# Altium schematic symbol library Schlib.SchLib: 725 symbols (part 4 of 6) (continued)
## MCP1702T-3302E/CB
designator U?  (value not drawn)
44dB@(100Hz) 250mA Fixed 3.3V Positive 13.2V SOT-23-3L Linear Voltage Regulators (LDO) ROHS; Manufacturer: Microchip; Manufacturer Part Number: MCP1702T-3302E/CB; Accuracy: 2%; Dropout Voltage: 525mV; Input Bias Current: 2µA; Min Input Voltage: 2.7V; Nominal Supply Current: 5µA; Number of Channels: 1; Power Dissipation: 253mW; Supplier: RS; Supplier Part Number: 7386578P; RoHS: Compliant; Category: LDO Voltage Regulators; Stock: 4180; Pricing: 30=0.449, 100=0.409 (GBP); Projected EOL Date: 2034-09-28; Case/Package: SOT-23; Contact Plating: Tin; Country of Assembly: Taiwan, Thailand; Country of Fabrication: United States of America; Country of Origin: Taiwan, Thailand; Export Control Classification Number (ECCN) Code: EAR99; Height: 1.3mm; Harmonized Tariff Schedule (HTS) Code: 8542.39.0060; Introduction Date: 2006-09-28; Lead Free: Lead Free; Length: 3.1mm; Lifecycle Status: Production; Max Supply Voltage: 13.2V; Max Operating Temperature: 125°C; Max Output current: 250mA; Min Operating Temperature: -40°C; Min Output Voltage: 3.3V; Mounting Technology: Surface Mount; Nominal Output Voltage: 3.3V; Number of Outputs: 1; Pins: 3; Output Current: 250mA; Output Type: Fixed; Output Voltage: 3.3V; Output Voltage Accuracy: 2%; Packaging: Cut Tape; Polarity: Positive; Quiescent Current: 5µA; Radiation Hardening: No; REACH SVHC: No; Schedule B: 8542390000, 8542390000|8542390000|8542390000|8542390000|8542390000; Width: 1.8mm; ComponentLink1URL: https://datasheet.octopart.com:443/MCP1702T-3302E/CB-Microchip-datasheet-10060743.pdf?src-supplier=LKR; ComponentLink1Description: https://datasheet.octopart.com:443/MCP1702T-3302E/CB-Microchip-datasheet-10060743.pdf?src-supplier=LKR; ComponentLink2URL: https://datasheet.octopart.com:443/MCP1702T-3302E-CB-Microchip-datasheet-175858685.pdf?src-supplier=Microchip; ComponentLink2Description: https://datasheet.octopart.com:443/MCP1702T-3302E-CB-Microchip-datasheet-175858685.pdf?src-supplier=Microchip; ComponentLink3URL: https://datasheet.octopart.com:443/MCP1702T-3302E/CB-Microchip-datasheet-15716.pdf?src-supplier=TME; ComponentLink3Description: https://datasheet.octopart.com:443/MCP1702T-3302E/CB-Microchip-datasheet-15716.pdf?src-supplier=TME; ComponentLink4URL: https://datasheet.octopart.com:443/MCP1702T-3302E-CB-Microchip-datasheet-142675560.pdf?src-supplier=TME; ComponentLink4Description: https://datasheet.octopart.com:443/MCP1702T-3302E-CB-Microchip-datasheet-142675560.pdf?src-supplier=TME; ComponentLink5URL: https://datasheet.octopart.com:443/MCP1702T-3302E-CB-Microchip-datasheet-141094228.pdf?src-supplier=TME; ComponentLink5Description: https://datasheet.octopart.com:443/MCP1702T-3302E-CB-Microchip-datasheet-141094228.pdf?src-supplier=TME; ComponentLink6URL: https://datasheet.octopart.com:443/MCP1702T-3302E-CB-Microchip-datasheet-17900278.pdf?src-supplier=Electro+Sonic; ComponentLink6Description: https://datasheet.octopart.com:443/MCP1702T-3302E-CB-Microchip-datasheet-17900278.pdf?src-supplier=Electro+Sonic; ComponentLink7URL: https://datasheet.octopart.com:443/MCP1702T-3302E/CB-Microchip-datasheet-8331944.pdf?src-supplier=element14; ComponentLink7Description: https://datasheet.octopart.com:443/MCP1702T-3302E/CB-Microchip-datasheet-8331944.pdf?src-supplier=element14; ComponentLink8URL: https://datasheet.octopart.com:443/MCP1702T-3302E/CB-Microchip-datasheet-9646180.pdf?src-supplier=RS+(Formerly+Allied+Electronics); ComponentLink8Description: https://datasheet.octopart.com:443/MCP1702T-3302E/CB-Microchip-datasheet-9646180.pdf?src-supplier=RS+(Formerly+Allied+Electronics); ComponentLink9URL: https://datasheet.octopart.com:443/MCP1702T-3302E/CB-Microchip-datasheet-8324231.pdf?src-supplier=Future+Electronics; ComponentLink9Description: https://datasheet.octopart.com:443/MCP1702T-3302E/CB-Microchip-datasheet-8324231.pdf?src-supplier=Future+Electronics; ComponentLink10URL: https://datasheet.octopart.com:443/MCP1702T-3302E/CB-Microchip-datasheet-14172058.pdf?src-supplier=iiiC; ComponentLink10Description: https://datasheet.octopart.com:443/MCP1702T-3302E/CB-Microchip-datasheet-14172058.pdf?src-supplier=iiiC; ComponentLink11URL: http://sigma.octopart.com:80/188455080/materials_sheet/Microchip-MCP1702T-3302E-CB.pdf?src-supplier=Compliance+Statements; ComponentLink11Description: http://sigma.octopart.com:80/188455080/materials_sheet/Microchip-MCP1702T-3302E-CB.pdf?src-supplier=Compliance+Statements; ComponentLink12URL: http://sigma.octopart.com:80/rohs_statement/Microchip-company-71.pdf?src-supplier=Compliance+Statements; ComponentLink12Description: http://sigma.octopart.com:80/rohs_statement/Microchip-company-71.pdf?src-supplier=Compliance+Statements; ComponentLink13URL: http://sigma.octopart.com:80/reach_statement/Microchip-company-70.pdf?src-supplier=Compliance+Statements; ComponentLink13Description: http://sigma.octopart.com:80/reach_statement/Microchip-company-70.pdf?src-supplier=Compliance+Statements; ComponentLink14URL: http://sigma.octopart.com:80/conflict_mineral_statement/Microchip-company-69.pdf?src-supplier=Compliance+Statements; ComponentLink14Description: http://sigma.octopart.com:80/conflict_mineral_statement/Microchip-company-69.pdf?src-supplier=Compliance+Statements; ComponentLink15URL: http://sigma.octopart.com:80/conflict_mineral_statement/Microchip-company-68.pdf?src-supplier=Compliance+Statements; ComponentLink15Description: http://sigma.octopart.com:80/conflict_mineral_statement/Microchip-company-68.pdf?src-supplier=Compliance+Statements
footprint SOT-23A-3
pins: 1 GND, 2 VOUT, 3 VIN

## MCP6004T-I/ST
designator U?  (value not drawn)
IC OPAMP GP 1MHZ RRO 14TSSOP; Manufacturer: Microchip; Manufacturer Part Number: MCP6004T-I/ST; Supplier: Farnell; Supplier Part Number: 2764393; RoHS: Yes; Category: Amplifiers - Op Amps, Buffer, Instrumentation; Stock: 62843; Pricing: 1=0.589, 25=0.516, 100=0.474 (EUR); ComponentLink1URL: https://datasheet.ciiva.com/26922/getdatasheetpartid-774801-26922663.pdf?src-supplier=Verical; ComponentLink1Description: https://datasheet.ciiva.com/26922/getdatasheetpartid-774801-26922663.pdf?src-supplier=Verical; ComponentLink2URL: https://datasheet.ciiva.com/4761/21733e-41017-4761977.pdf?src-supplier=Mouser; ComponentLink2Description: https://datasheet.ciiva.com/4761/21733e-41017-4761977.pdf?src-supplier=Mouser; ComponentLink3URL: https://datasheet.ciiva.com/14151/mcp600x-eng-tds-14151462.pdf?src-supplier=Distrelec; ComponentLink3Description: https://datasheet.ciiva.com/14151/mcp600x-eng-tds-14151462.pdf?src-supplier=Distrelec; ComponentLink4URL: https://datasheet.ciiva.com/11706/jp011705-11706863.pdf?src-supplier=Avnet; ComponentLink4Description: https://datasheet.ciiva.com/11706/jp011705-11706863.pdf?src-supplier=Avnet; ComponentLink5URL: https://datasheet.ciiva.com/1804/21733j-1804853.pdf?src-supplier=Digikey; ComponentLink5Description: https://datasheet.ciiva.com/1804/21733j-1804853.pdf?src-supplier=Digikey; ComponentLink6URL: https://datasheet.ciiva.com/29639/filehandler-aspxddocname-en011705-29639002.pdf?src-supplier=Digikey; ComponentLink6Description: https://datasheet.ciiva.com/29639/filehandler-aspxddocname-en011705-29639002.pdf?src-supplier=Digikey; ComponentLink7URL: https://datasheet.ciiva.com/29639/filehandler-aspxddocname-en011705-29639003.pdf?src-supplier=Digikey; ComponentLink7Description: https://datasheet.ciiva.com/29639/filehandler-aspxddocname-en011705-29639003.pdf?src-supplier=Digikey; ComponentLink8URL: https://datasheet.ciiva.com/29639/filehandler-aspxddocname-en011705-29639004.pdf?src-supplier=Digikey; ComponentLink8Description: https://datasheet.ciiva.com/29639/filehandler-aspxddocname-en011705-29639004.pdf?src-supplier=Digikey; ComponentLink9URL: https://datasheet.ciiva.com/16221/filehandler-aspxddocname-en011705-16221052.pdf?src-supplier=Future+Electronics; ComponentLink9Description: https://datasheet.ciiva.com/16221/filehandler-aspxddocname-en011705-16221052.pdf?src-supplier=Future+Electronics
footprint MCP6004T-I/ST
part A pins: 1 Out, 2 -, 3 +, 4 V+, 11 V-
part B pins: 5 +, 6 -, 7 Out
part C pins: 8 Out, 9 -, 10 +
part D pins: 12 +, 13 -, 14 Out

## MCS0402MD3323BE000
designator R?  value 332kR  Tolerance: 0.1%  (hidden comment: *)
Res, 332K, 0.1W, 0402, Thin Film Rohs Compliant: Yes |Vishay MCS0402MD3323BE000; Manufacturer: Vishay BCcomponents; Supplier: Digikey; Supplier Part Number: 541-MCS0402MD3323BE000CT-ND; Manufacturer Part Number: MCS0402MD3323BE000; RoHS: Yes; Category: Chip SMD Resistors; Stock: 6505; Pricing: 1=0.35, 10=0.256, 50=0.1982, 100=0.1762, 500=0.13216, 1000=0.11611, 5000=0.09487 (USD); Case/Package: 0402
footprint R 0402 (1005 Metric) (Chip Capacitor, Body 1.0x0.5mm, IPC High Density)
pins: 1 B, 2 A

## MCS04020C1009FE000
designator R?  value 10R  (hidden comment: *)
Res Thin Film 0402 10 Ohm 1% 1/16W ±50ppm/°C Molded SMD SMD Paper T/R; Manufacturer: Vishay BCcomponents; Manufacturer Part Number: MCS04020C1009FE000; Power Rating: 63mW; Voltage Rating: 50V; Max Power Dissipation: 100mW; Supplier: Mouser; Supplier Part Number: 594-MCS04020C1009FE0; RoHS: Yes; Category: Chip SMD Resistors; Stock: 74071; Pricing: 1=0.1, 10=0.049, 50=0.049, 100=0.044, 1000=0.023, 10000=0.017 (USD); Case/Package: 0402; Weight: 2.1E-05oz; Case Code (Imperial): 0402; Case Code (Metric): 1005; Contact Plating: Tin; Min Operating Temperature: -55°C; Max Operating Temperature: 125°C; Packaging: Tape and Reel; Tolerance: 1%; Package Quantity: 10000; Resistor Type: Thin Film; Number of Terminations: 2; Temperature Coefficient: 50ppm/°C; Voltage Rating (DC): 50V; Series: MCS - Professional; Features: Anti-Sulfur; Length: 0.039inch; Width: 0.5mm; Height: 0.015inch; Radiation Hardening: No; Reach SVHC Compliant: No; Lead Free: Lead Free; RoHS Compliant: Yes; ComponentLink1URL: https://datasheet.ciiva.com/2575/mc-pro-2575438.pdf?src-supplier=Digikey; ComponentLink1Description: https://datasheet.ciiva.com/2575/mc-pro-2575438.pdf?src-supplier=Digikey; Resistance Tolerance: 1%
footprint R 0402 (1005 Metric) (Chip Capacitor, Body 1.0x0.5mm, IPC High Density)
pins: 1 B, 2 A

## MEM2051-00-195-00-A
designator J?  (value not drawn)
Connector, Memory Card, Micro Sd, 8 Position, 1.1MM, Full Reel; Manufacturer: Global Connector Technology; Manufacturer Part Number: MEM2051-00-195-00-A; Number of Contacts: 8; Supplier: Future Electronics; Supplier Part Number: 2076423; RoHS: Yes; Category: Memory Connectors; Stock: 765; Pricing: 1=1.32000, 10=1.20000, 40=1.12000, 150=1.05000, 500=0.98500 (USD); Mounting Technology: Surface Mount; Contact Material: Bronze; Contact Plating: Gold; Termination: SMD/SMT; Series: MEM2051; Connector Type: Connector; Reach SVHC Compliant: Yes; Lead Free: Lead Free; RoHS Compliant: Yes; ComponentLink1URL: https://datasheet.ciiva.com/5803/mem2051-5803826.pdf?src-supplier=Farnell; ComponentLink1Description: https://datasheet.ciiva.com/5803/mem2051-5803826.pdf?src-supplier=Farnell; ComponentLink2URL: https://datasheet.ciiva.com/7633/1792863-7633864.pdf?src-supplier=Element14; ComponentLink2Description: https://datasheet.ciiva.com/7633/1792863-7633864.pdf?src-supplier=Element14; ComponentLink3URL: https://datasheet.ciiva.com/46398/1792863-46398839.pdf?src-supplier=Element14; ComponentLink3Description: https://datasheet.ciiva.com/46398/1792863-46398839.pdf?src-supplier=Element14; ComponentLink4URL: https://datasheet.ciiva.com/46398/mem2051-46398838.pdf?src-supplier=Element14; ComponentLink4Description: https://datasheet.ciiva.com/46398/mem2051-46398838.pdf?src-supplier=Element14; ComponentLink5URL: https://datasheet.ciiva.com/46425/mem2051-46425480.pdf?src-supplier=Element14; ComponentLink5Description: https://datasheet.ciiva.com/46425/mem2051-46425480.pdf?src-supplier=Element14
footprint MEM2051-00-195-00-A
pins: 1 DATA2 (io), 2 DATA3/CD (io), 3 CMD (io), 4 VDD (power), 5 CLK (io), 6 VSS (power), 7 DATA0 (io), 8 DATA1 (io), 9 DETECH

## MI0805K400R-10
designator FB?
Ferrite Beads Power Chip Bead 40Ohm 25% 100MHz 1.5A 0805 T/R; Manufacturer: Laird; Manufacturer Part Number: MI0805K400R-10; Manufacturer Lifecycle Status: ACTIVE; DC Resistance (DCR): 50mΩ; Impedance: 40Ω; Clock Frequency: 1GHz; Number of Circuits: 1; Supplier: Avnet; Supplier Part Number: MI0805K400R-10; RoHS: Compliant; Category: Ferrite Beads and Chips; Stock: 4000; Pricing: 4000=0.05706, 40000=0.03418, 100000=0.01862, 200000=0.01846, 400000=0.0183 (USD); Case/Package: 0805; Case Code (Imperial): 0805; Case Code (Metric): 2012; Contact Plating: Tin; Core Material: Ferrite; Country of Origin: Mainland China; Current Rating: 1.5A; Depth: 1.45mm; Export Control Classification Number (ECCN) Code: EAR99; Frequency: 100MHz; Height: 900µm; Harmonized Tariff Schedule (HTS) Code: 8504.50.80.00; Introduction Date: 2005-09-13; Lead Free: Lead Free; Length: 2mm; Lifecycle Status: Production; Material: Ferrite; Max Current Rating: 1.5A; Max DC Current: 1.5A; Max Operating Temperature: 125°C; Min Operating Temperature: -55°C; Mounting Technology: Surface Mount; Number of Lines: 1; Pins: 2; Number of Terminals: 2; Packaging: Tape and Reel; REACH SVHC: Yes; RMS Current (Irms): 1.5A; ESR: 50mΩ; Termination: SMD/SMT; Test Frequency: 100MHz; Tolerance: 25%; Weight: 111.130131mg; Width: 1.25mm; ComponentLink1URL: https://datasheet.octopart.com:443/MI0805K400R-10-Laird-datasheet-142022600.pdf?src-supplier=IHS; ComponentLink1Description: https://datasheet.octopart.com:443/MI0805K400R-10-Laird-datasheet-142022600.pdf?src-supplier=IHS; ComponentLink2URL: https://datasheet.octopart.com:443/MI0805K400R-10-Steward-datasheet-181241738.pdf?src-supplier=IHS; ComponentLink2Description: https://datasheet.octopart.com:443/MI0805K400R-10-Steward-datasheet-181241738.pdf?src-supplier=IHS; ComponentLink3URL: https://datasheet.octopart.com:443/MI0805K400R-10-Laird-datasheet-14357329.pdf?src-supplier=element14+APAC; ComponentLink3Description: https://datasheet.octopart.com:443/MI0805K400R-10-Laird-datasheet-14357329.pdf?src-supplier=element14+APAC; ComponentLink4URL: https://datasheet.octopart.com:443/MI0805K400R-10-Steward-datasheet-65579.pdf?src-supplier=Mouser; ComponentLink4Description: https://datasheet.octopart.com:443/MI0805K400R-10-Steward-datasheet-65579.pdf?src-supplier=Mouser; ComponentLink5URL: https://datasheet.octopart.com:443/MI0805K400R-10-Laird-datasheet-147640328.pdf?src-supplier=Sager+Electronics; ComponentLink5Description: https://datasheet.octopart.com:443/MI0805K400R-10-Laird-datasheet-147640328.pdf?src-supplier=Sager+Electronics; ComponentLink6URL: https://datasheet.octopart.com:443/MI0805K400R-10-Laird-datasheet-137323476.pdf?src-supplier=Sager+Electronics; ComponentLink6Description: https://datasheet.octopart.com:443/MI0805K400R-10-Laird-datasheet-137323476.pdf?src-supplier=Sager+Electronics; ComponentLink7URL: https://datasheet.octopart.com:443/MI0805K400R-10-Laird-datasheet-62119981.pdf?src-supplier=RS+(Formerly+Allied+Electronics); ComponentLink7Description: https://datasheet.octopart.com:443/MI0805K400R-10-Laird-datasheet-62119981.pdf?src-supplier=RS+(Formerly+Allied+Electronics); ComponentLink8URL: http://sigma.octopart.com:80/152757296/reach_statement/Laird-MI0805K400R-10.pdf?src-supplier=Compliance+Statements; ComponentLink8Description: http://sigma.octopart.com:80/152757296/reach_statement/Laird-MI0805K400R-10.pdf?src-supplier=Compliance+Statements; ComponentLink9URL: http://sigma.octopart.com:80/152757297/rohs_statement/Laird-MI0805K400R-10.pdf?src-supplier=Compliance+Statements; ComponentLink9Description: http://sigma.octopart.com:80/152757297/rohs_statement/Laird-MI0805K400R-10.pdf?src-supplier=Compliance+Statements; ComponentLink10URL: http://sigma.octopart.com:80/conflict_mineral_statement/Laird-company-56.pdf?src-supplier=Compliance+Statements; ComponentLink10Description: http://sigma.octopart.com:80/conflict_mineral_statement/Laird-company-56.pdf?src-supplier=Compliance+Statements
footprint IND_MI0805K400R-10_LRD
pins: 1, 2

## MIC5209-3.3YS
designator U?
MIC5209 Series 3.3 V Fixed Output 500 mA SMT Low-Noise LDO Regulator - SOT-223; Manufacturer: Microchip; Manufacturer Part Number: MIC5209-3.3YS; Manufacturer Lifecycle Status: REL; Accuracy: 1%; Current Rating: 500mA; Max Supply Voltage: 16V; Min Input Voltage: 2.5V; Min Output Voltage: 3.3V; Number of Channels: 1; Polarity: Positive; Power Supply Rejection Ratio (PSRR): 75dB; Supplier: Avnet; Supplier Part Number: MIC5209-3.3YS; RoHS: Compliant; Category: LDO Voltage Regulators; Stock: 515; Pricing: 1=0.99, 2=0.985, 4=0.98, 8=0.975, 16=0.97 (USD); Projected EOL Date: 2034-01-28; Case/Package: SOT-223; Country of Assembly: China; Country of Fabrication: United States of America; Country of Origin: China; Export Control Classification Number (ECCN) Code: EAR99; Height: 1.6mm; Harmonized Tariff Schedule (HTS) Code: 8542.39.0060; Lead Free: Lead Free; Length: 6.5mm; Lifecycle Status: Production; Max Operating Temperature: 125°C; Max Output current: 500mA; Min Operating Temperature: -40°C; Mounting Technology: Surface Mount; Nominal Output Voltage: 3.3V; Number of Outputs: 1; Pins: 3; Number of Regulators: 1; Output Current: 500mA; Output Type: Fixed; Output Voltage: 3.3V; Output Voltage Accuracy: 1%; Packaging: Bulk; Radiation Hardening: No; REACH SVHC: No; Schedule B: 8542390000, 8542390000|8542390000|8542390000|8542390000|8542390000; Width: 3.5mm; ComponentLink1URL: https://datasheet.octopart.com:443/MIC5209-3.3YS-Microchip-datasheet-169258008.pdf?src-supplier=Microchip; ComponentLink1Description: https://datasheet.octopart.com:443/MIC5209-3.3YS-Microchip-datasheet-169258008.pdf?src-supplier=Microchip; ComponentLink2URL: https://datasheet.octopart.com:443/MIC5209-3.3YS-Microchip-datasheet-7980.pdf?src-supplier=element14+APAC; ComponentLink2Description: https://datasheet.octopart.com:443/MIC5209-3.3YS-Microchip-datasheet-7980.pdf?src-supplier=element14+APAC; ComponentLink3URL: https://datasheet.octopart.com:443/MIC5209-3.3YS-Microchip-datasheet-62314909.pdf?src-supplier=element14+APAC; ComponentLink3Description: https://datasheet.octopart.com:443/MIC5209-3.3YS-Microchip-datasheet-62314909.pdf?src-supplier=element14+APAC; ComponentLink4URL: https://datasheet.octopart.com:443/MIC5209-3.3YS-Microchip-datasheet-81461536.pdf?src-supplier=SHENGYU+ELECTRONICS; ComponentLink4Description: https://datasheet.octopart.com:443/MIC5209-3.3YS-Microchip-datasheet-81461536.pdf?src-supplier=SHENGYU+ELECTRONICS; ComponentLink5URL: https://datasheet.octopart.com:443/MIC5209-3.3YS-Microchip-datasheet-154742051.pdf?src-supplier=Electro+Sonic; ComponentLink5Description: https://datasheet.octopart.com:443/MIC5209-3.3YS-Microchip-datasheet-154742051.pdf?src-supplier=Electro+Sonic; ComponentLink6URL: https://datasheet.octopart.com:443/MIC5209-3.3YS-Microchip-datasheet-142675560.pdf?src-supplier=TME; ComponentLink6Description: https://datasheet.octopart.com:443/MIC5209-3.3YS-Microchip-datasheet-142675560.pdf?src-supplier=TME; ComponentLink7URL: https://datasheet.octopart.com:443/MIC5209-3.3YS-Micrel-datasheet-14169817.pdf?src-supplier=iiiC; ComponentLink7Description: https://datasheet.octopart.com:443/MIC5209-3.3YS-Micrel-datasheet-14169817.pdf?src-supplier=iiiC; ComponentLink8URL: http://sigma.octopart.com:80/188455477/materials_sheet/Microchip-MIC5209-3.3YS.pdf?src-supplier=Compliance+Statements; ComponentLink8Description: http://sigma.octopart.com:80/188455477/materials_sheet/Microchip-MIC5209-3.3YS.pdf?src-supplier=Compliance+Statements; ComponentLink9URL: http://sigma.octopart.com:80/188849348/materials_sheet/Microchip-MIC5209-3.3YS.pdf?src-supplier=Compliance+Statements; ComponentLink9Description: http://sigma.octopart.com:80/188849348/materials_sheet/Microchip-MIC5209-3.3YS.pdf?src-supplier=Compliance+Statements; ComponentLink10URL: http://sigma.octopart.com:80/192654186/materials_sheet/Microchip-MIC5209-3.3YS.pdf?src-supplier=Compliance+Statements; ComponentLink10Description: http://sigma.octopart.com:80/192654186/materials_sheet/Microchip-MIC5209-3.3YS.pdf?src-supplier=Compliance+Statements; ComponentLink11URL: http://sigma.octopart.com:80/rohs_statement/Microchip-company-71.pdf?src-supplier=Compliance+Statements; ComponentLink11Description: http://sigma.octopart.com:80/rohs_statement/Microchip-company-71.pdf?src-supplier=Compliance+Statements; ComponentLink12URL: http://sigma.octopart.com:80/reach_statement/Microchip-company-70.pdf?src-supplier=Compliance+Statements; ComponentLink12Description: http://sigma.octopart.com:80/reach_statement/Microchip-company-70.pdf?src-supplier=Compliance+Statements; ComponentLink13URL: http://sigma.octopart.com:80/conflict_mineral_statement/Microchip-company-69.pdf?src-supplier=Compliance+Statements; ComponentLink13Description: http://sigma.octopart.com:80/conflict_mineral_statement/Microchip-company-69.pdf?src-supplier=Compliance+Statements; ComponentLink14URL: http://sigma.octopart.com:80/conflict_mineral_statement/Microchip-company-68.pdf?src-supplier=Compliance+Statements; ComponentLink14Description: http://sigma.octopart.com:80/conflict_mineral_statement/Microchip-company-68.pdf?src-supplier=Compliance+Statements
footprint SOT-223_S_MCH
pins: 1 IN (power), 2 GND (power), 3 OUT (out), 4 GND (power)

## MIC5225-1.8YM5-TR
designator U?
Linear Voltage Regulator IC Positive Fixed 1 Output 150mA SOT-23-5; Manufacturer Part Number: MIC5225-1.8YM5-TR
footprint MIC5225-1.8
pins: ?1 NC/ADJ, ?2 OUT, ?3 IN, ?4 GND, ?5 EN

## MLF1005VR10JT000
designator L?  value 100nH  (hidden comment: *)
Inductor General Purpose Shielded Multi-Layer 0.1uH 5% 25MHz 10Q-Factor Ferrite 0.18A 0.51Ohm DCR 0402 T/R; Manufacturer: TDK; Manufacturer Part Number: MLF1005VR10JT000; Current Rating: 180mA; Shielding: Unshielded; DC Resistance (DCR): 510mR; Self Resonant Frequency: 450MHz; Supplier: Arrow Electronics; Supplier Part Number: MLF1005VR10JT000; RoHS: No; Category: Fixed Inductors; Stock: 80000; Pricing: 10000=0.078, 30000=0.0773, 50000=0.075 (USD); Mounting Technology: Surface Mount; Case/Package: 0402; Case Code (Metric): 1005; Case Code (Imperial): 0402; Core Material: Ferrite; Min Operating Temperature: -55°C; Max Operating Temperature: 125°C; Package Quantity: 1; Packaging: Cut Tape; Tolerance: 5%; Test Frequency: 25MHz; Series: MLF-J; Length: 0.039inch; Width: 0.02inch; Height - Seated (Max): 0.022inch; RoHS Compliant: No; ComponentLink1URL: https://datasheet.ciiva.com/29698/inductor-commercial-standard-mlf-en-29698013.pdf?src-supplier=Digikey; ComponentLink1Description: https://datasheet.ciiva.com/29698/inductor-commercial-standard-mlf-en-29698013.pdf?src-supplier=Digikey; ComponentLink2URL: https://datasheet.ciiva.com/29698/inductor-commercial-standard-mlf-en-29698014.pdf?src-supplier=Digikey; ComponentLink2Description: https://datasheet.ciiva.com/29698/inductor-commercial-standard-mlf-en-29698014.pdf?src-supplier=Digikey; ComponentLink3URL: https://datasheet.ciiva.com/29698/inductor-commercial-standard-mlf-en-29698015.pdf?src-supplier=Digikey; ComponentLink3Description: https://datasheet.ciiva.com/29698/inductor-commercial-standard-mlf-en-29698015.pdf?src-supplier=Digikey
footprint L 0402
pins: 1 B, 2 A

## MLX90640ESF-BAB-000-SP
designator CAM?  (value not drawn)
MLX90640 Series 2.9 to 3.6 V 32 x 24 Thermal Sensor IR Array - TO-39-4 Metal Can; Manufacturer: Melexis; Manufacturer Part Number: MLX90640ESF-BAB-000-SP; Supplier: Mouser; Supplier Part Number: 482-MLX90640ESFBABSP; RoHS: No; Category: Temperature and Humidity Sensors; Stock: 1794; Pricing: 1=55.17000, 10=49.70000, 50=42.93000, 100=41.02000, 1000=41.02000, 10000=41.02000 (USD); Case/Package: TO-39-4; Min Operating Temperature: -40°C; Max Operating Temperature: 85°C; Packaging: Bulk; ComponentLink1URL: https://www.melexis.com/-/media/files/documents/datasheets/mlx90640-datasheet-melexis.pdf?src-supplier=Digi-Key; ComponentLink1Description: https://www.melexis.com/-/media/files/documents/datasheets/mlx90640-datasheet-melexis.pdf?src-supplier=Digi-Key
pins: 1 SDA, 2 VDD, 3 GND, 4 SCL
text: T_CAM

## MLZ2012M470WTD25
designator L?  value 47µH  (hidden comment: *)
Inductor Power Shielded Multi-Layer 47uH 20% 2MHz Ferrite 0.17A 4.81Ohm DCR 0805; Manufacturer: TDK; Manufacturer Part Number: MLZ2012M470WTD25; Manufacturer Lifecycle Status: PRODUCTION; Current Rating: 170mA; DC Resistance (DCR): 4.81Ω; Number of Circuits: 1; Saturation Current: 50mA; Shielding: Yes; Supplier: Farnell; Supplier Part Number: 3386737; RoHS: Compliant; Category: Fixed Inductors; Stock: 224; Pricing: 5=0.0904, 50=0.0641, 250=0.0534, 500=0.0514, 1000=0.0493, 2000=0.0452 (GBP); Case/Package: 0805; Case Code (Imperial): 0805; Case Code (Metric): 2012; China RoHS: Compliant; Core Material: Ferrite; Depth: 1.25mm; Height: 1.25mm; Height - Seated (Max): 1.4478mm; Lead Free: Lead Free; Length: 2mm; Lifecycle Status: Production; Max Current Rating: 170mA; Max DC Current: 170mA; Max Length: 2.2mm; Max Operating Temperature: 125°C; Max Width: 1.45mm; Min Length: 1.8mm; Min Operating Temperature: -55°C; Min Width: 1.05mm; Mounting Technology: Surface Mount; Number of Terminals: 2; Packaging: Tape & Reel (TR); Radiation Hardening: No; Ratings: AEC-Q200; REACH SVHC: Yes; RMS Current (Irms): 170mA; Schedule B: 8504500000, 8504500000|8504500000|8504500000|8504500000|8504500000; ESR: 4.81Ω; Termination: SMD/SMT; Test Frequency: 2MHz; Tolerance: 20%; Weight: 5.499807mg; Width: 1.25mm; ComponentLink1URL: https://datasheet.octopart.com:443/MLZ2012M470WTD25-TDK-datasheet-181268411.pdf?src-supplier=IHS; ComponentLink1Description: https://datasheet.octopart.com:443/MLZ2012M470WTD25-TDK-datasheet-181268411.pdf?src-supplier=IHS; ComponentLink2URL: https://datasheet.octopart.com:443/MLZ2012M470WTD25-TDK-datasheet-155380169.pdf?src-supplier=TDK; ComponentLink2Description: https://datasheet.octopart.com:443/MLZ2012M470WTD25-TDK-datasheet-155380169.pdf?src-supplier=TDK; ComponentLink3URL: https://datasheet.octopart.com:443/MLZ2012M470WTD25-TDK-datasheet-136874819.pdf?src-supplier=TME; ComponentLink3Description: https://datasheet.octopart.com:443/MLZ2012M470WTD25-TDK-datasheet-136874819.pdf?src-supplier=TME; ComponentLink4URL: https://datasheet.octopart.com:443/MLZ2012M470WTD25-TDK-datasheet-115068144.pdf?src-supplier=Future+Electronics; ComponentLink4Description: https://datasheet.octopart.com:443/MLZ2012M470WTD25-TDK-datasheet-115068144.pdf?src-supplier=Future+Electronics
footprint L 0805
pins: 1 B, 2 A

## MLZ2012N101LT000
designator L?  value 100uH  (hidden comment: *)
Inductor Power Shielded Multi-Layer 100uH 20% 2MHz Ferrite 0.14A 4.55Ohm DCR 0805 T/R; Manufacturer: TDK; Manufacturer Part Number: MLZ2012N101LT000; Supplier: Chip One Stop; Supplier Part Number: MLZ2012N101LT000; RoHS: Yes; Category: Fixed Inductors; Stock: 10732; Pricing: 50=10.8, 100=9.51, 200=8.98, 500=8.36, 1000=7.95, 2000=7.61 (JPY); ComponentLink1URL: https://datasheet.ciiva.com/29698/inductor-commercial-decoupling-mlz-en-29698903.pdf?src-supplier=Digikey; ComponentLink1Description: https://datasheet.ciiva.com/29698/inductor-commercial-decoupling-mlz-en-29698903.pdf?src-supplier=Digikey; ComponentLink2URL: https://datasheet.ciiva.com/29698/inductor-commercial-decoupling-mlz-en-29698904.pdf?src-supplier=Digikey; ComponentLink2Description: https://datasheet.ciiva.com/29698/inductor-commercial-decoupling-mlz-en-29698904.pdf?src-supplier=Digikey; ComponentLink3URL: https://datasheet.ciiva.com/29698/inductor-commercial-decoupling-mlz-en-29698905.pdf?src-supplier=Digikey; ComponentLink3Description: https://datasheet.ciiva.com/29698/inductor-commercial-decoupling-mlz-en-29698905.pdf?src-supplier=Digikey; Case/Package: 0805
footprint L 0805
pins: 1 B, 2 A

## MMSZ5231BT1G
designator D?  Zener Voltage: 5.1V
MMSZ5231BT1 Series 500 mW 10 mA 5.1 V SMT Zener Voltage Regulator - SOD-123; Manufacturer: ON Semiconductor; Manufacturer Part Number: MMSZ5231BT1G; Material: Plastic; Max Power Dissipation: 500mW; Max Reverse Leakage Current: 5uA; Impedance: 17R; Test Current: 20mA; Tolerance: 5%; Forward Voltage: 900mV; Zener Current: 10mA; Breakdown Voltage: 5.36V; Supplier: Rs; Supplier Part Number: 5453049P; RoHS: Yes; Category: Zener Diodes; Stock: 65000; Pricing: 100=0.09, 200=0.084, 500=0.08, 1000=0.07 (EUR); Case/Package: SOD-123-2; Pins: 2; Min Operating Temperature: -55°C; Max Operating Temperature: 150°C; Packaging: Tape and Reel; Package Quantity: 3000; Voltage Tolerance: 5%; Power Dissipation: 500mW; Working Voltage: 5.1V; Max Reverse Current: 5uA; Voltage Rating (DC): 5.1V; Power Rating: 500mW; Series: Automotive, AEC-Q101; Length: 2.69mm; Width: 1.6mm; Height: 1.12mm; Lead Free: Lead Free; Reach SVHC Compliant: No; RoHS Compliant: Yes
pins: 1 C, 2 A

## MMSZ5239BT1G
designator D?  Working Voltage: 9.1  (hidden comment: *)
Zener Diode 9.1V 500mW ±5% Surface Mount SOD-123; Manufacturer: ON Semiconductor; Manufacturer Part Number: MMSZ5239BT1G; Supplier: Future Electronics; Supplier Part Number: 3740289; RoHS: Yes; Category: Zener Diodes; Stock: 60000; Pricing: 3000=0.0162, 9000=0.0156, 30000=0.015, 60000=0.0147, 120000=0.0141 (USD); ComponentLink1URL: https://datasheet.ciiva.com/15142/getdatasheetpartid-70269-15142362.pdf?src-supplier=Verical; ComponentLink1Description: https://datasheet.ciiva.com/15142/getdatasheetpartid-70269-15142362.pdf?src-supplier=Verical; ComponentLink2URL: https://datasheet.ciiva.com/8345/mmsz5221bt1-d-8345983.pdf?src-supplier=Avnet; ComponentLink2Description: https://datasheet.ciiva.com/8345/mmsz5221bt1-d-8345983.pdf?src-supplier=Avnet; ComponentLink3URL: https://datasheet.ciiva.com/894/mmsz5221bt1-d-894992.pdf?src-supplier=Digikey; ComponentLink3Description: https://datasheet.ciiva.com/894/mmsz5221bt1-d-894992.pdf?src-supplier=Digikey; ComponentLink4URL: https://datasheet.ciiva.com/894/mmsz5221bt1-d-894993.pdf?src-supplier=Digikey; ComponentLink4Description: https://datasheet.ciiva.com/894/mmsz5221bt1-d-894993.pdf?src-supplier=Digikey; ComponentLink5URL: https://datasheet.ciiva.com/894/mmsz5221bt1-d-894994.pdf?src-supplier=Digikey; ComponentLink5Description: https://datasheet.ciiva.com/894/mmsz5221bt1-d-894994.pdf?src-supplier=Digikey; ComponentLink6URL: https://datasheet.ciiva.com/22747/86126-22747886.pdf?src-supplier=Element14; ComponentLink6Description: https://datasheet.ciiva.com/22747/86126-22747886.pdf?src-supplier=Element14
footprint MMSZ5242BT1G
pins: 1 C, 2 A

## MMSZ5242BT1G
designator D?  Voltage Rating (DC): 12V  (hidden comment: *)
DIODE ZENER 12V 500MW SOD123 / Zener Diode Single 12V 5% 30Ohm 500mW 2-Pin SOD-123 T/R; Manufacturer: ON Semiconductor; Manufacturer Part Number: MMSZ5242BT1G; Material: 4239ConductorMaterial; Supplier: Rs; Supplier Part Number: 5453140P; RoHS: Yes; Category: Zener Diodes; Stock: 25860; Pricing: 200=0.088, 500=0.077, 1000=0.068, 2000=0.061 (EUR); Power Rating: 500mW; Lead Free: 5697LeadFree; ComponentLink1URL: https://datasheet.ciiva.com/27056/2011774-27056169.pdf?src-supplier=Jameco; ComponentLink1Description: https://datasheet.ciiva.com/27056/2011774-27056169.pdf?src-supplier=Jameco; ComponentLink2URL: https://datasheet.ciiva.com/8347/mmsz5221bt1-d-8347981.pdf?src-supplier=Avnet; ComponentLink2Description: https://datasheet.ciiva.com/8347/mmsz5221bt1-d-8347981.pdf?src-supplier=Avnet; ComponentLink3URL: https://datasheet.ciiva.com/894/mmsz5221bt1-d-894902.pdf?src-supplier=Digikey; ComponentLink3Description: https://datasheet.ciiva.com/894/mmsz5221bt1-d-894902.pdf?src-supplier=Digikey; ComponentLink4URL: https://datasheet.ciiva.com/894/mmsz5221bt1-d-894903.pdf?src-supplier=Digikey; ComponentLink4Description: https://datasheet.ciiva.com/894/mmsz5221bt1-d-894903.pdf?src-supplier=Digikey; ComponentLink5URL: https://datasheet.ciiva.com/894/mmsz5221bt1-d-894904.pdf?src-supplier=Digikey; ComponentLink5Description: https://datasheet.ciiva.com/894/mmsz5221bt1-d-894904.pdf?src-supplier=Digikey; ComponentLink6URL: https://datasheet.ciiva.com/14558/70099546-14558252.pdf?src-supplier=Allied+Electronics; ComponentLink6Description: https://datasheet.ciiva.com/14558/70099546-14558252.pdf?src-supplier=Allied+Electronics; ComponentLink7URL: https://datasheet.ciiva.com/46450/86126-46450622.pdf?src-supplier=Element14; ComponentLink7Description: https://datasheet.ciiva.com/46450/86126-46450622.pdf?src-supplier=Element14; ComponentLink8URL: https://datasheet.ciiva.com/16397/mmsz5221bt1-d-16397052.pdf?src-supplier=Future+Electronics; ComponentLink8Description: https://datasheet.ciiva.com/16397/mmsz5221bt1-d-16397052.pdf?src-supplier=Future+Electronics
footprint MMSZ5242BT1G
pins: 1 C, 2 A

## MMSZ5245BT1G
designator D?  Working Voltage: 15  (hidden comment: *)
Diode Zener Single 15 Volt 5% 500mW 2-Pin SOD-123 Tape and Reel; Manufacturer: ON Semiconductor; Manufacturer Part Number: MMSZ5245BT1G; Material: 4239ConductorMaterial; Supplier: Rs; Supplier Part Number: 5453162P; RoHS: Yes; Category: Zener Diodes; Stock: 54080; Pricing: 200=0.095, 500=0.083, 1000=0.073, 2000=0.066 (EUR); Lead Free: 5697LeadFree; ComponentLink1URL: https://datasheet.ciiva.com/8346/mmsz5221bt1-d-8346021.pdf?src-supplier=Avnet; ComponentLink1Description: https://datasheet.ciiva.com/8346/mmsz5221bt1-d-8346021.pdf?src-supplier=Avnet; ComponentLink2URL: https://datasheet.ciiva.com/4731/mmsz5221bt1-d-4731737.pdf?src-supplier=Mouser; ComponentLink2Description: https://datasheet.ciiva.com/4731/mmsz5221bt1-d-4731737.pdf?src-supplier=Mouser; ComponentLink3URL: https://datasheet.ciiva.com/895/mmsz5221bt1-d-895130.pdf?src-supplier=Digikey; ComponentLink3Description: https://datasheet.ciiva.com/895/mmsz5221bt1-d-895130.pdf?src-supplier=Digikey; ComponentLink4URL: https://datasheet.ciiva.com/895/mmsz5221bt1-d-895131.pdf?src-supplier=Digikey; ComponentLink4Description: https://datasheet.ciiva.com/895/mmsz5221bt1-d-895131.pdf?src-supplier=Digikey; ComponentLink5URL: https://datasheet.ciiva.com/895/mmsz5221bt1-d-895132.pdf?src-supplier=Digikey; ComponentLink5Description: https://datasheet.ciiva.com/895/mmsz5221bt1-d-895132.pdf?src-supplier=Digikey; ComponentLink6URL: https://datasheet.ciiva.com/8026/86126-8026875.pdf?src-supplier=Element14; ComponentLink6Description: https://datasheet.ciiva.com/8026/86126-8026875.pdf?src-supplier=Element14; ComponentLink7URL: https://datasheet.ciiva.com/8026/86126-8026878.pdf?src-supplier=Element14; ComponentLink7Description: https://datasheet.ciiva.com/8026/86126-8026878.pdf?src-supplier=Element14
pins: 1 C, 2 A

## MP2759AGQ-0000-Z
designator U?  (value not drawn)
Battery Charger, Li-ion/li-pol, 26.4V;; Manufacturer: Monolithic Power Systems; Manufacturer Part Number: MP2759AGQ-0000-Z; Supplier: Digikey; Supplier Part Number: 1589-MP2759AGQ-0000-ZCT-ND; RoHS: No; Stock: 10247; Pricing: 1=2.97, 10=2.668, 25=2.5224, 100=2.1861, 250=2.07404, 500=1.86102, 1000=1.56954, 2500=1.49106 (USD); ComponentLink1URL: https://datasheet.octopart.com/MP2759AGQ-0000-Z-Monolithic-Power-Systems-datasheet-163719273.pdf?src-supplier=Monolithic+Power+Systems; ComponentLink1Description: https://datasheet.octopart.com/MP2759AGQ-0000-Z-Monolithic-Power-Systems-datasheet-163719273.pdf?src-supplier=Monolithic+Power+Systems
footprint MP2759AGQ
pins: 1 IN, 2 PMID, 3 SW, 4 BST, 5 PGND, 6 PGND, 7 PGND, 8 ~{STAT}, 9 ~{ACOK}, 10 CELL, 11 VB, 12 NTC, 13 ILIM, 14 BATT, 15 CSP, 16 AGND, 17 VCC, 18 ISET, 19 VLIM

## MPU-6050
designator U?  (value not drawn)
IMU (Inertial Measurement Unit), 6-Axis, Accelerometer, Gyroscope; Manufacturer: TDK InvenSense; Sensor Type: Accelerometer,Gyroscope,6 Axis; Output Type: I2C; Power Rating: 100mW; Value: 5.6kR; Tolerance: 1%; Voltage Rating: 75V; Supplier: Farnell; Supplier Part Number: 1864742; Manufacturer Part Number: MPU-6050; RoHS: Yes; Category: Inertial Measurement Units (IMUs); Pricing: 1=1, 10=29.92 (EUR); Mounting Technology: Surface Mount; Case/Package: QFN; Case Code (Imperial): 0603; Case Code (Metric): 1608; Min Operating Temperature: -40°C; Max Operating Temperature: 85°C; Packaging: Cut Tape; Series: -; Radiation Hardening: No; RoHS Compliant: Yes; ComponentLink1URL: https://datasheet.ciiva.com/1513/1788002-1513632.pdf?src-supplier=Element14; ComponentLink1Description: https://datasheet.ciiva.com/1513/1788002-1513632.pdf?src-supplier=Element14; ComponentLink2URL: https://datasheet.ciiva.com/22731/1788002-22731434.pdf?src-supplier=Element14; ComponentLink2Description: https://datasheet.ciiva.com/22731/1788002-22731434.pdf?src-supplier=Element14
footprint MPU-6050
pins: 1 CLKIN, 2 NC, 3 NC, 4 NC, 5 NC, 6 AUX_DA, 7 AUX_CL, 8 VLOGIC, 9 AD0, 10 REGOUT, 11 FSYNC, 12 INT, 13 VDD, 14 NC, 15 NC, 16 NC, 17 NC, 18 GND (power), 19 RESV, 20 CPOUT, 21 RESV, 22 RESV, 23 SCL, 24 SDA, 25 TP (power)

## MPU-6555
designator U?
Accelerometer, Gyroscope, 6 Axis Sensor IÂ²C, SPI Output; MF: TDK InvenSense; Price: None; Value: mpu-6555; Package: QFN-24 TDK; SnapEDA_Link: https://www.snapeda.com/parts/MPU-6500/TDK%20InvenSense/view-part/48597/?ref=snap; DigiKey-Purchase-URL: https://snapeda.com/shop?store=DigiKey&id=48597; MP: MPU-6555; Availability: Warning
footprint MPU6555
pins: 1 NC, 2 NC, 3 NC, 4 NC, 5 NC, 6 NC, 7 AUX_CL, 8 VDDIO, 9 AD0/SDO, 10 REGOUT, 11 FSYNC, 12 INT, 13 VDD, 14 NC, 15 NC, 16 NC, 17 NC, 18 GND, 19 RESV_1, 20 RESV_2, 21 AUX_DA, 22 NCS, 23 SCL/SCLK, 24 SDA/SDI, 25 EXP

## MR30PW-M
designator J?  (value not drawn)
Manufacturer Part Number: MR30PW-M
footprint MR30PW-M
pins: 1 Ph3, 2 Ph2, 3 Ph1, 4 SH, 5 SH
